# Altium footprint library 6-Connectors-3.PcbLib: 153 footprints (part 6 of 11)
Each footprint in its own frame and in the unit in brackets; x right, y up, seen from the top. Pads: shape width x height; smd on the part's side, far side on the other; paste and mask are expansions set on the pad; w line width, h text height; cw(c..) or ccw(c..) is an arc to the next point about the centre after c.
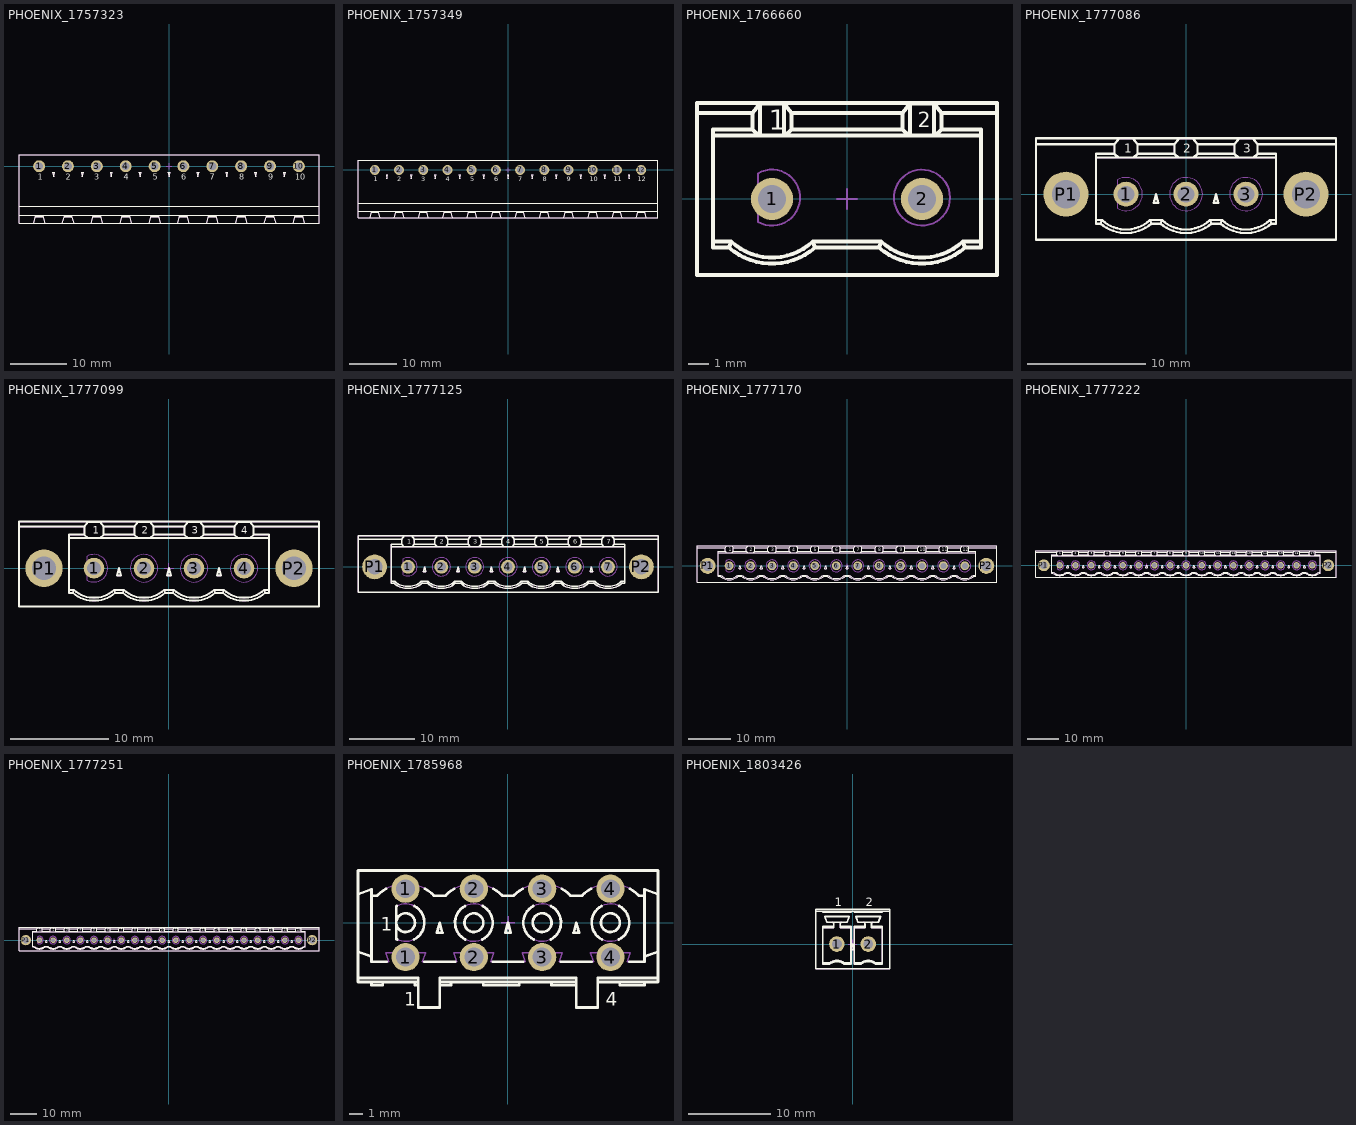
[diagram p5: the footprints below, top view; thin cyan lines are the x and y axes]

## PHOENIX_1757323 [mm] "PHOENIX MSTBA Serie, Pitch 5.08mm, 12A, 250V, 10 Positions Header"
height 8.6
pads (10):
  round 2.1 hole 1.4: 1(-22.86,0) 2(-17.78,0) 3(-12.7,0) 4(-7.62,0) 5(-2.54,0) 6(2.54,0) 7(7.62,0) 8(12.7,0) 9(17.78,0) 10(22.86,0)
Top Overlay:
  lines w0.2: -26.4,-8.626 26.4,-8.626 ; -26.4,-7 26.4,-7 ; -23.835,-10 -23.465,-8.7 -22.255,-8.7 -21.885,-10 ; -23.516,-8.88 -22.204,-8.88 ; -23.105,-8.7 -23.092,-8.75 -22.628,-8.75 -22.615,-8.7 ; -18.755,-10 -18.385,-8.7 -17.175,-8.7 -16.805,-10 ; -18.436,-8.88 -17.124,-8.88 ; -18.025,-8.7 -18.012,-8.75 -17.548,-8.75 -17.535,-8.7 ; -13.675,-10 -13.305,-8.7 -12.095,-8.7 -11.725,-10 ; -13.356,-8.88 -12.044,-8.88 ; -12.945,-8.7 -12.932,-8.75 -12.468,-8.75 -12.455,-8.7 ; -8.595,-10 -8.225,-8.7 -7.015,-8.7 -6.645,-10 ; -8.276,-8.88 -6.964,-8.88 ; -7.865,-8.7 -7.852,-8.75 -7.388,-8.75 -7.375,-8.7 ; -3.515,-10 -3.145,-8.7 -1.935,-8.7 -1.565,-10 ; -3.196,-8.88 -1.884,-8.88 ; -2.785,-8.7 -2.772,-8.75 -2.308,-8.75 -2.295,-8.7 ; 1.565,-10 1.935,-8.7 3.145,-8.7 3.515,-10 ; 1.884,-8.88 3.196,-8.88 ; 2.295,-8.7 2.308,-8.75 2.772,-8.75 2.785,-8.7 ; 6.645,-10 7.015,-8.7 8.225,-8.7 8.595,-10 ; 6.964,-8.88 8.276,-8.88 ; 7.375,-8.7 7.388,-8.75 7.852,-8.75 7.865,-8.7 ; 11.725,-10 12.095,-8.7 13.305,-8.7 13.675,-10 ; 12.044,-8.88 13.356,-8.88 ; 12.455,-8.7 12.468,-8.75 12.932,-8.75 12.945,-8.7 ; 16.805,-10 17.175,-8.7 18.385,-8.7 18.755,-10 ; 17.124,-8.88 18.436,-8.88 ; 17.535,-8.7 17.548,-8.75 18.012,-8.75 18.025,-8.7 ; 21.885,-10 22.255,-8.7 23.465,-8.7 23.835,-10 ; 22.204,-8.88 23.516,-8.88 ; 22.615,-8.7 22.628,-8.75 23.092,-8.75 23.105,-8.7 ; -26.4,-10 -26.4,2 26.4,2 26.4,-10 -26.4,-10 ; -20.521,-1.05 -20.32,-1.8 -20.119,-1.05 -20.521,-1.05 ; -15.441,-1.05 -15.24,-1.8 -15.039,-1.05 -15.441,-1.05 ; -10.361,-1.05 -10.16,-1.8 -9.959,-1.05 -10.361,-1.05 ; -5.281,-1.05 -5.08,-1.8 -4.879,-1.05 -5.281,-1.05 ; -0.201,-1.05 0,-1.8 0.201,-1.05 -0.201,-1.05 ; 4.879,-1.05 5.08,-1.8 5.281,-1.05 4.879,-1.05 ; 9.959,-1.05 10.16,-1.8 10.361,-1.05 9.959,-1.05 ; 15.039,-1.05 15.24,-1.8 15.441,-1.05 15.039,-1.05 ; 20.119,-1.05 20.32,-1.8 20.521,-1.05 20.119,-1.05
  text "3" at -13.14,-2.4 h1
  text "2" at -18.14,-2.4 h1
  text "1" at -23.14,-2.4 h1
  text "4" at -7.94,-2.4 h1
  text "7" at 7.18,-2.4 h1
  text "6" at 2.18,-2.4 h1
  text "5" at -2.82,-2.4 h1
  text "8" at 12.38,-2.4 h1
  text "9" at 17.46,-2.4 h1
  text "10" at 22.2,-2.4 h1
Mechanical 8:
  lines w0.1: -3.04,0 -2.54,0 ; -2.54,-0.5 -2.54,0 ; -2.54,0.5 -2.54,0 ; -2.04,0 -2.54,0 ; -0.5,0 0,0 ; 0,-0.5 0,0 ; 0,0.5 0,0 ; 0.5,0 0,0 ; -22.86,0 -23.36,0 -22.86,0 ; -22.86,0 -22.86,-0.5 -22.86,0 ; -22.86,0 -22.36,0 -22.86,0 ; -22.86,0 -22.86,0.5 -22.86,0 ; -17.78,0 -18.28,0 -17.78,0 ; -17.78,0 -17.78,-0.5 -17.78,0 ; -17.78,0 -17.28,0 -17.78,0 ; -17.78,0 -17.78,0.5 -17.78,0 ; -12.7,0 -13.2,0 -12.7,0 ; -12.7,0 -12.7,-0.5 -12.7,0 ; -12.7,0 -12.2,0 -12.7,0 ; -12.7,0 -12.7,0.5 -12.7,0 ; 2.54,0 2.04,0 2.54,0 ; 2.54,0 2.54,-0.5 2.54,0 ; 2.54,0 3.04,0 2.54,0 ; 2.54,0 2.54,0.5 2.54,0 ; 7.62,0 7.12,0 7.62,0 ; 7.62,0 7.62,-0.5 7.62,0 ; 7.62,0 8.12,0 7.62,0 ; 7.62,0 7.62,0.5 7.62,0 ; 12.7,0 12.2,0 12.7,0 ; 12.7,0 12.7,-0.5 12.7,0 ; 12.7,0 13.2,0 12.7,0 ; 12.7,0 12.7,0.5 12.7,0 ; 17.78,0 17.28,0 17.78,0 ; 17.78,0 17.78,-0.5 17.78,0 ; 17.78,0 18.28,0 17.78,0 ; 17.78,0 17.78,0.5 17.78,0 ; 22.86,0 22.36,0 22.86,0 ; 22.86,0 22.86,-0.5 22.86,0 ; 22.86,0 23.36,0 22.86,0 ; 22.86,0 22.86,0.5 22.86,0
Mechanical 14:
  lines w0.1: -26.4,-8.626 26.4,-8.626 ; -26.4,-7 26.4,-7 ; -23.835,-10 -23.465,-8.7 -22.255,-8.7 -21.885,-10 ; -23.516,-8.88 -22.204,-8.88 ; -23.105,-8.7 -23.092,-8.75 -22.628,-8.75 -22.615,-8.7 ; -18.755,-10 -18.385,-8.7 -17.175,-8.7 -16.805,-10 ; -18.436,-8.88 -17.124,-8.88 ; -18.025,-8.7 -18.012,-8.75 -17.548,-8.75 -17.535,-8.7 ; -13.675,-10 -13.305,-8.7 -12.095,-8.7 -11.725,-10 ; -13.356,-8.88 -12.044,-8.88 ; -12.945,-8.7 -12.932,-8.75 -12.468,-8.75 -12.455,-8.7 ; -8.595,-10 -8.225,-8.7 -7.015,-8.7 -6.645,-10 ; -8.276,-8.88 -6.964,-8.88 ; -7.865,-8.7 -7.852,-8.75 -7.388,-8.75 -7.375,-8.7 ; -3.515,-10 -3.145,-8.7 -1.935,-8.7 -1.565,-10 ; -3.196,-8.88 -1.884,-8.88 ; -2.785,-8.7 -2.772,-8.75 -2.308,-8.75 -2.295,-8.7 ; 1.565,-10 1.935,-8.7 3.145,-8.7 3.515,-10 ; 1.884,-8.88 3.196,-8.88 ; 2.295,-8.7 2.308,-8.75 2.772,-8.75 2.785,-8.7 ; 6.645,-10 7.015,-8.7 8.225,-8.7 8.595,-10 ; 6.964,-8.88 8.276,-8.88 ; 7.375,-8.7 7.388,-8.75 7.852,-8.75 7.865,-8.7 ; 11.725,-10 12.095,-8.7 13.305,-8.7 13.675,-10 ; 12.044,-8.88 13.356,-8.88 ; 12.455,-8.7 12.468,-8.75 12.932,-8.75 12.945,-8.7 ; 16.805,-10 17.175,-8.7 18.385,-8.7 18.755,-10 ; 17.124,-8.88 18.436,-8.88 ; 17.535,-8.7 17.548,-8.75 18.012,-8.75 18.025,-8.7 ; 21.885,-10 22.255,-8.7 23.465,-8.7 23.835,-10 ; 22.204,-8.88 23.516,-8.88 ; 22.615,-8.7 22.628,-8.75 23.092,-8.75 23.105,-8.7 ; -26.4,-10 -26.4,2 26.4,2 26.4,-10 -26.4,-10 ; -20.521,-1.05 -20.32,-1.8 -20.119,-1.05 -20.521,-1.05 ; -15.441,-1.05 -15.24,-1.8 -15.039,-1.05 -15.441,-1.05 ; -10.361,-1.05 -10.16,-1.8 -9.959,-1.05 -10.361,-1.05 ; -5.281,-1.05 -5.08,-1.8 -4.879,-1.05 -5.281,-1.05 ; -0.201,-1.05 0,-1.8 0.201,-1.05 -0.201,-1.05 ; 4.879,-1.05 5.08,-1.8 5.281,-1.05 4.879,-1.05 ; 9.959,-1.05 10.16,-1.8 10.361,-1.05 9.959,-1.05 ; 15.039,-1.05 15.24,-1.8 15.441,-1.05 15.039,-1.05 ; 20.119,-1.05 20.32,-1.8 20.521,-1.05 20.119,-1.05
3D body "PHOENIX_1757323.stp": height 8.6, standoff -3.5, extent -26.4,-10 26.4,2

## PHOENIX_1757349 [mm] "PHOENIX MSTBA Serie, Pitch 5.08mm, 12A, 250V, 12 Positions Header"
height 8.6
pads (12):
  round 2.1 hole 1.4: 1(-27.94,0) 2(-22.86,0) 3(-17.78,0) 4(-12.7,0) 5(-7.62,0) 6(-2.54,0) 7(2.54,0) 8(7.62,0) 9(12.7,0) 10(17.78,0) 11(22.86,0) 12(27.94,0)
Top Overlay:
  lines w0.2: -31.48,-8.626 31.48,-8.626 ; -31.48,-7 31.48,-7 ; -28.915,-10 -28.545,-8.7 -27.335,-8.7 -26.965,-10 ; -28.596,-8.88 -27.284,-8.88 ; -28.185,-8.7 -28.172,-8.75 -27.708,-8.75 -27.695,-8.7 ; -23.835,-10 -23.465,-8.7 -22.255,-8.7 -21.885,-10 ; -23.516,-8.88 -22.204,-8.88 ; -23.105,-8.7 -23.092,-8.75 -22.628,-8.75 -22.615,-8.7 ; -18.755,-10 -18.385,-8.7 -17.175,-8.7 -16.805,-10 ; -18.436,-8.88 -17.124,-8.88 ; -18.025,-8.7 -18.012,-8.75 -17.548,-8.75 -17.535,-8.7 ; -13.675,-10 -13.305,-8.7 -12.095,-8.7 -11.725,-10 ; -13.356,-8.88 -12.044,-8.88 ; -12.945,-8.7 -12.932,-8.75 -12.468,-8.75 -12.455,-8.7 ; -8.595,-10 -8.225,-8.7 -7.015,-8.7 -6.645,-10 ; -8.276,-8.88 -6.964,-8.88 ; -7.865,-8.7 -7.852,-8.75 -7.388,-8.75 -7.375,-8.7 ; -3.515,-10 -3.145,-8.7 -1.935,-8.7 -1.565,-10 ; -3.196,-8.88 -1.884,-8.88 ; -2.785,-8.7 -2.772,-8.75 -2.308,-8.75 -2.295,-8.7 ; 1.565,-10 1.935,-8.7 3.145,-8.7 3.515,-10 ; 1.884,-8.88 3.196,-8.88 ; 2.295,-8.7 2.308,-8.75 2.772,-8.75 2.785,-8.7 ; 6.645,-10 7.015,-8.7 8.225,-8.7 8.595,-10 ; 6.964,-8.88 8.276,-8.88 ; 7.375,-8.7 7.388,-8.75 7.852,-8.75 7.865,-8.7 ; 11.725,-10 12.095,-8.7 13.305,-8.7 13.675,-10 ; 12.044,-8.88 13.356,-8.88 ; 12.455,-8.7 12.468,-8.75 12.932,-8.75 12.945,-8.7 ; 16.805,-10 17.175,-8.7 18.385,-8.7 18.755,-10 ; 17.124,-8.88 18.436,-8.88 ; 17.535,-8.7 17.548,-8.75 18.012,-8.75 18.025,-8.7 ; 21.885,-10 22.255,-8.7 23.465,-8.7 23.835,-10 ; 22.204,-8.88 23.516,-8.88 ; 22.615,-8.7 22.628,-8.75 23.092,-8.75 23.105,-8.7 ; 26.965,-10 27.335,-8.7 28.545,-8.7 28.915,-10 ; 27.284,-8.88 28.596,-8.88 ; 27.695,-8.7 27.708,-8.75 28.172,-8.75 28.185,-8.7 ; -31.48,-10 31.48,-10 31.48,2 -31.48,2 -31.48,-10 ; -25.601,-1.05 -25.199,-1.05 -25.4,-1.8 -25.601,-1.05 ; -20.521,-1.05 -20.119,-1.05 -20.32,-1.8 -20.521,-1.05 ; -15.441,-1.05 -15.039,-1.05 -15.24,-1.8 -15.441,-1.05 ; -10.361,-1.05 -9.959,-1.05 -10.16,-1.8 -10.361,-1.05 ; -5.281,-1.05 -4.879,-1.05 -5.08,-1.8 -5.281,-1.05 ; -0.201,-1.05 0.201,-1.05 0,-1.8 -0.201,-1.05 ; 4.879,-1.05 5.281,-1.05 5.08,-1.8 4.879,-1.05 ; 9.959,-1.05 10.361,-1.05 10.16,-1.8 9.959,-1.05 ; 15.039,-1.05 15.441,-1.05 15.24,-1.8 15.039,-1.05 ; 20.119,-1.05 20.521,-1.05 20.32,-1.8 20.119,-1.05 ; 25.199,-1.05 25.601,-1.05 25.4,-1.8 25.199,-1.05
  text "10" at 17.12,-2.4 h1
  text "9" at 12.38,-2.4 h1
  text "8" at 7.3,-2.4 h1
  text "5" at -7.9,-2.4 h1
  text "6" at -2.9,-2.4 h1
  text "7" at 2.1,-2.4 h1
  text "4" at -13.02,-2.4 h1
  text "1" at -28.22,-2.4 h1
  text "2" at -23.22,-2.4 h1
  text "3" at -18.22,-2.4 h1
  text "11" at 22.2,-2.4 h1
  text "12" at 27.28,-2.4 h1
Mechanical 8:
  lines w0.1: -3.04,0 -2.54,0 ; -2.54,-0.5 -2.54,0 ; -2.54,0.5 -2.54,0 ; -2.04,0 -2.54,0 ; -0.5,0 0,0 ; 0,-0.5 0,0 ; 0,0.5 0,0 ; 0.5,0 0,0 ; -27.94,0 -27.94,0.5 -27.94,0 ; -27.94,0 -27.44,0 -27.94,0 ; -27.94,0 -27.94,-0.5 -27.94,0 ; -27.94,0 -28.44,0 -27.94,0 ; -22.86,0 -22.86,0.5 -22.86,0 ; -22.86,0 -22.36,0 -22.86,0 ; -22.86,0 -22.86,-0.5 -22.86,0 ; -22.86,0 -23.36,0 -22.86,0 ; -17.78,0 -17.78,0.5 -17.78,0 ; -17.78,0 -17.28,0 -17.78,0 ; -17.78,0 -17.78,-0.5 -17.78,0 ; -17.78,0 -18.28,0 -17.78,0 ; -12.7,0 -12.7,0.5 -12.7,0 ; -12.7,0 -12.2,0 -12.7,0 ; -12.7,0 -12.7,-0.5 -12.7,0 ; -12.7,0 -13.2,0 -12.7,0 ; 2.54,0 2.54,0.5 2.54,0 ; 2.54,0 3.04,0 2.54,0 ; 2.54,0 2.54,-0.5 2.54,0 ; 2.54,0 2.04,0 2.54,0 ; 7.62,0 7.62,0.5 7.62,0 ; 7.62,0 8.12,0 7.62,0 ; 7.62,0 7.62,-0.5 7.62,0 ; 7.62,0 7.12,0 7.62,0 ; 12.7,0 12.7,0.5 12.7,0 ; 12.7,0 13.2,0 12.7,0 ; 12.7,0 12.7,-0.5 12.7,0 ; 12.7,0 12.2,0 12.7,0 ; 17.78,0 17.78,0.5 17.78,0 ; 17.78,0 18.28,0 17.78,0 ; 17.78,0 17.78,-0.5 17.78,0 ; 17.78,0 17.28,0 17.78,0 ; 22.86,0 22.86,0.5 22.86,0 ; 22.86,0 23.36,0 22.86,0 ; 22.86,0 22.86,-0.5 22.86,0 ; 22.86,0 22.36,0 22.86,0 ; 27.94,0 27.94,0.5 27.94,0 ; 27.94,0 28.44,0 27.94,0 ; 27.94,0 27.94,-0.5 27.94,0 ; 27.94,0 27.44,0 27.94,0
Mechanical 14:
  lines w0.1: -31.48,-8.626 31.48,-8.626 ; -31.48,-7 31.48,-7 ; -28.915,-10 -28.545,-8.7 -27.335,-8.7 -26.965,-10 ; -28.596,-8.88 -27.284,-8.88 ; -28.185,-8.7 -28.172,-8.75 -27.708,-8.75 -27.695,-8.7 ; -23.835,-10 -23.465,-8.7 -22.255,-8.7 -21.885,-10 ; -23.516,-8.88 -22.204,-8.88 ; -23.105,-8.7 -23.092,-8.75 -22.628,-8.75 -22.615,-8.7 ; -18.755,-10 -18.385,-8.7 -17.175,-8.7 -16.805,-10 ; -18.436,-8.88 -17.124,-8.88 ; -18.025,-8.7 -18.012,-8.75 -17.548,-8.75 -17.535,-8.7 ; -13.675,-10 -13.305,-8.7 -12.095,-8.7 -11.725,-10 ; -13.356,-8.88 -12.044,-8.88 ; -12.945,-8.7 -12.932,-8.75 -12.468,-8.75 -12.455,-8.7 ; -8.595,-10 -8.225,-8.7 -7.015,-8.7 -6.645,-10 ; -8.276,-8.88 -6.964,-8.88 ; -7.865,-8.7 -7.852,-8.75 -7.388,-8.75 -7.375,-8.7 ; -3.515,-10 -3.145,-8.7 -1.935,-8.7 -1.565,-10 ; -3.196,-8.88 -1.884,-8.88 ; -2.785,-8.7 -2.772,-8.75 -2.308,-8.75 -2.295,-8.7 ; 1.565,-10 1.935,-8.7 3.145,-8.7 3.515,-10 ; 1.884,-8.88 3.196,-8.88 ; 2.295,-8.7 2.308,-8.75 2.772,-8.75 2.785,-8.7 ; 6.645,-10 7.015,-8.7 8.225,-8.7 8.595,-10 ; 6.964,-8.88 8.276,-8.88 ; 7.375,-8.7 7.388,-8.75 7.852,-8.75 7.865,-8.7 ; 11.725,-10 12.095,-8.7 13.305,-8.7 13.675,-10 ; 12.044,-8.88 13.356,-8.88 ; 12.455,-8.7 12.468,-8.75 12.932,-8.75 12.945,-8.7 ; 16.805,-10 17.175,-8.7 18.385,-8.7 18.755,-10 ; 17.124,-8.88 18.436,-8.88 ; 17.535,-8.7 17.548,-8.75 18.012,-8.75 18.025,-8.7 ; 21.885,-10 22.255,-8.7 23.465,-8.7 23.835,-10 ; 22.204,-8.88 23.516,-8.88 ; 22.615,-8.7 22.628,-8.75 23.092,-8.75 23.105,-8.7 ; 26.965,-10 27.335,-8.7 28.545,-8.7 28.915,-10 ; 27.284,-8.88 28.596,-8.88 ; 27.695,-8.7 27.708,-8.75 28.172,-8.75 28.185,-8.7 ; -31.48,-10 31.48,-10 31.48,2 -31.48,2 -31.48,-10 ; -25.601,-1.05 -25.199,-1.05 -25.4,-1.8 -25.601,-1.05 ; -20.521,-1.05 -20.119,-1.05 -20.32,-1.8 -20.521,-1.05 ; -15.441,-1.05 -15.039,-1.05 -15.24,-1.8 -15.441,-1.05 ; -10.361,-1.05 -9.959,-1.05 -10.16,-1.8 -10.361,-1.05 ; -5.281,-1.05 -4.879,-1.05 -5.08,-1.8 -5.281,-1.05 ; -0.201,-1.05 0.201,-1.05 0,-1.8 -0.201,-1.05 ; 4.879,-1.05 5.281,-1.05 5.08,-1.8 4.879,-1.05 ; 9.959,-1.05 10.361,-1.05 10.16,-1.8 9.959,-1.05 ; 15.039,-1.05 15.441,-1.05 15.24,-1.8 15.039,-1.05 ; 20.119,-1.05 20.521,-1.05 20.32,-1.8 20.119,-1.05 ; 25.199,-1.05 25.601,-1.05 25.4,-1.8 25.199,-1.05
3D body "PHOENIX_1757349.stp": height 8.6, standoff -3.5, extent -31.48,-10 31.48,2

## PHOENIX_1766660 [mm] "PCB Header, 12A 400 V, Pitch: 7.5mm, 2 Positions, GMSTBVA Serie"
height 12
pads (2):
  round 2.1 hole 1.4: 1(-3.75,0) 2(3.75,0)
Top Overlay:
  lines w0.2: -7.5,4.3 -4.725,4.3 ; -6.7,-2.13 -5.79,-2.13 ; -6.7,3.163 6.7,3.163 ; -4.394,3.163 -4.725,3.475 ; -4.355,3.163 -4.355,4.773 ; -3.145,3.163 -3.145,4.773 ; -3.106,3.163 -2.775,3.475 ; 3.106,3.163 2.775,3.475 ; 3.145,3.163 3.145,4.773 ; 4.355,3.163 4.355,4.773 ; 4.394,3.163 4.725,3.475 ; 6.7,-2.13 5.79,-2.13 ; 7.5,4.3 4.725,4.3 ; -5.904,-2.43 ccw(c-3.75,0.07) -1.596,-2.43 ; -5.904,-2.43 -5.79,-2.13 ; -5.904,-2.43 -6.7,-2.43 -6.7,3.475 -4.725,3.475 ; -5.79,-2.13 ccw(c-3.75,0.07) -1.71,-2.13 ; -4.725,3.475 -4.725,4.3 ; -4.725,4.3 -4.355,4.773 ; -4.355,4.773 -3.145,4.773 ; -3.145,4.773 -2.775,4.3 ; -2.775,3.475 2.775,3.475 ; -2.775,3.475 -2.775,4.3 ; -2.775,4.3 2.775,4.3 ; -1.71,-2.13 1.71,-2.13 ; -1.71,-2.13 -1.596,-2.43 ; -1.596,-2.43 1.596,-2.43 ; 1.596,-2.43 ccw(c3.75,0.07) 5.904,-2.43 ; 1.596,-2.43 1.71,-2.13 ; 1.71,-2.13 ccw(c3.75,0.07) 5.79,-2.13 ; 2.775,3.475 2.775,4.3 ; 2.775,4.3 3.145,4.773 ; 3.145,4.773 4.355,4.773 ; 4.355,4.773 4.725,4.3 ; 4.725,3.475 4.725,4.3 ; 4.725,3.475 6.7,3.475 6.7,-2.43 5.904,-2.43 ; 5.79,-2.13 5.904,-2.43 ; -7.5,-3.8 -7.5,4.8 7.5,4.8 7.5,-3.8 -7.5,-3.8
  text "2" at 3.53,3.575 h0.75
  text "1" at -3.91,3.46 h1
Mechanical 8:
  lines w0.1: -4.25,0 -3.75,0 ; -3.75,-0.5 -3.75,0 ; -3.75,0.5 -3.75,0 ; -3.25,0 -3.75,0 ; -0.5,0 0,0 ; 0,-0.5 0,0 ; 0,0.5 0,0 ; 0.5,0 0,0 ; 3.25,0 3.75,0 ; 3.75,-0.5 3.75,0 ; 3.75,0.5 3.75,0 ; 4.25,0 3.75,0
Mechanical 14:
  circle w0.1: c3.75,0.07 r1.4
  lines w0.1: -7.5,4.3 -4.725,4.3 ; -6.7,-2.13 -5.79,-2.13 ; -6.7,3.163 6.7,3.163 ; -4.394,3.163 -4.725,3.475 ; -4.355,3.163 -4.355,4.773 ; -3.145,3.163 -3.145,4.773 ; -3.106,3.163 -2.775,3.475 ; 3.106,3.163 2.775,3.475 ; 3.145,3.163 3.145,4.773 ; 4.355,3.163 4.355,4.773 ; 4.394,3.163 4.725,3.475 ; 6.7,-2.13 5.79,-2.13 ; 7.5,4.3 4.725,4.3 ; -5.904,-2.43 ccw(c-3.75,0.07) -1.596,-2.43 ; -5.904,-2.43 -5.79,-2.13 ; -5.904,-2.43 -6.7,-2.43 -6.7,3.475 -4.725,3.475 ; -5.79,-2.13 ccw(c-3.75,0.07) -1.71,-2.13 ; -4.725,3.475 -4.725,4.3 ; -4.725,4.3 -4.355,4.773 ; -4.355,4.773 -3.145,4.773 ; -3.145,4.773 -2.775,4.3 ; -2.775,3.475 2.775,3.475 ; -2.775,3.475 -2.775,4.3 ; -2.775,4.3 2.775,4.3 ; -1.71,-2.13 1.71,-2.13 ; -1.71,-2.13 -1.596,-2.43 ; -1.596,-2.43 1.596,-2.43 ; 1.596,-2.43 ccw(c3.75,0.07) 5.904,-2.43 ; 1.596,-2.43 1.71,-2.13 ; 1.71,-2.13 ccw(c3.75,0.07) 5.79,-2.13 ; 2.775,3.475 2.775,4.3 ; 2.775,4.3 3.145,4.773 ; 3.145,4.773 4.355,4.773 ; 4.355,4.773 4.725,4.3 ; 4.725,3.475 4.725,4.3 ; 4.725,3.475 6.7,3.475 6.7,-2.43 5.904,-2.43 ; 5.79,-2.13 5.904,-2.43 ; -7.5,-3.8 -7.5,4.8 7.5,4.8 7.5,-3.8 -7.5,-3.8 ; -4.45,-1.142 ccw(c-3.75,0.07) -4.45,1.282 -4.45,-1.142
  text "2" at 3.53,3.575 h0.75
  text "1" at -3.91,3.46 h1
3D body "PHOENIX_1766660.stp": height 12, standoff -3.9, extent -7.5,-3.8 7.5,4.8

## PHOENIX_1777086 [mm] "PCB Header, 12A, 320V, Pitch: 5.08mm, 3 Positions, MSTBV Serie"
height 12
pads (5):
  round 2.1 hole 1.4: 1(-5.08,0) 2(0,0) 3(5.08,0)
  round 3.8 hole 2.4: P1(-10.16,0) P2(10.16,0)
Top Overlay:
  lines w0.2: -12.7,4.23 -6.055,4.23 ; -7.62,-2.2 -7.12,-2.2 ; -7.62,3.093 7.62,3.093 ; -5.724,3.093 -6.055,3.405 ; -4.436,3.093 -4.105,3.405 ; -0.644,3.093 -0.975,3.405 ; 0.644,3.093 0.975,3.405 ; 4.436,3.093 4.105,3.405 ; 5.724,3.093 6.055,3.405 ; 7.62,-2.2 7.12,-2.2 ; 12.7,4.23 6.055,4.23 ; -7.234,-2.5 ccw(c-5.08,0) -2.926,-2.5 ; -7.234,-2.5 -7.12,-2.2 ; -7.234,-2.5 -7.62,-2.5 -7.62,3.405 -6.055,3.405 ; -7.12,-2.2 ccw(c-5.08,0) -3.04,-2.2 ; -6.055,3.405 -6.055,4.23 ; -6.055,4.23 -5.685,4.703 -4.475,4.703 -4.105,4.23 ; -4.105,3.405 -4.105,4.23 ; -4.105,3.405 -0.975,3.405 ; -4.105,4.23 -0.975,4.23 ; -3.04,-2.2 -2.04,-2.2 ; -3.04,-2.2 -2.926,-2.5 ; -2.926,-2.5 -2.154,-2.5 ; -2.154,-2.5 ccw(c0,0) 2.154,-2.5 ; -2.154,-2.5 -2.04,-2.2 ; -2.04,-2.2 ccw(c0,0) 2.04,-2.2 ; -0.975,3.405 -0.975,4.23 ; -0.975,4.23 -0.605,4.703 0.605,4.703 0.975,4.23 ; 0.975,3.405 0.975,4.23 ; 0.975,3.405 4.105,3.405 ; 0.975,4.23 4.105,4.23 ; 2.04,-2.2 3.04,-2.2 ; 2.04,-2.2 2.154,-2.5 ; 2.154,-2.5 2.926,-2.5 ; 2.926,-2.5 ccw(c5.08,0) 7.234,-2.5 ; 2.926,-2.5 3.04,-2.2 ; 3.04,-2.2 ccw(c5.08,0) 7.12,-2.2 ; 4.105,3.405 4.105,4.23 ; 4.105,4.23 4.475,4.703 5.685,4.703 6.055,4.23 ; 6.055,3.405 6.055,4.23 ; 6.055,3.405 7.62,3.405 7.62,-2.5 7.234,-2.5 ; 7.12,-2.2 7.234,-2.5 ; -12.7,-3.87 12.7,-3.87 12.7,4.73 -12.7,4.73 -12.7,-3.87 ; -2.741,-0.75 -2.339,-0.75 -2.54,0 -2.741,-0.75 ; 2.339,-0.75 2.741,-0.75 2.54,0 2.339,-0.75
  text "1" at -5.22,3.505 h0.75
  text "2" at -0.22,3.505 h0.75
  text "3" at 4.851,3.505 h0.75
Mechanical 8:
  lines w0.1: -10.66,0 -10.16,0 ; -10.16,-0.5 -10.16,0 ; -10.16,0.5 -10.16,0 ; -9.66,0 -10.16,0 ; -5.58,0 -5.08,0 ; -5.08,-0.5 -5.08,0 ; -5.08,0.5 -5.08,0 ; -4.58,0 -5.08,0 ; -0.5,0 0,0 ; 0,-0.5 0,0 ; 0,0.5 0,0 ; 0.5,0 0,0 ; 4.58,0 5.08,0 ; 5.08,-0.5 5.08,0 ; 5.08,0.5 5.08,0 ; 5.58,0 5.08,0 ; 9.66,0 10.16,0 ; 10.16,-0.5 10.16,0 ; 10.16,0.5 10.16,0 ; 10.66,0 10.16,0
Mechanical 14:
  circle w0.1: c5.08,0 r1.4
  circle w0.1: c0,0 r1.4
  circle w0.1: c-10.16,0 r1.25
  circle w0.1: c10.16,0 r1.25
  lines w0.1: -12.7,4.23 -6.055,4.23 ; -7.62,-2.2 -7.12,-2.2 ; -7.62,3.093 7.62,3.093 ; -5.724,3.093 -6.055,3.405 ; -4.436,3.093 -4.105,3.405 ; -0.644,3.093 -0.975,3.405 ; 0.644,3.093 0.975,3.405 ; 4.436,3.093 4.105,3.405 ; 5.724,3.093 6.055,3.405 ; 7.62,-2.2 7.12,-2.2 ; 12.7,4.23 6.055,4.23 ; -7.234,-2.5 ccw(c-5.08,0) -2.926,-2.5 ; -7.234,-2.5 -7.12,-2.2 ; -7.234,-2.5 -7.62,-2.5 -7.62,3.405 -6.055,3.405 ; -7.12,-2.2 ccw(c-5.08,0) -3.04,-2.2 ; -6.055,3.405 -6.055,4.23 ; -6.055,4.23 -5.685,4.703 -4.475,4.703 -4.105,4.23 ; -5.58,-0.5 -4.58,-0.5 ; -5.58,-0.5 -5.58,0.5 ; -5.58,-0.5 -5.312,-0.232 ; -5.58,0.5 -4.58,0.5 ; -5.58,0.5 -5.312,0.232 ; -5.312,-0.232 -4.848,-0.232 ; -5.312,-0.232 -5.312,0.232 ; -5.312,0.232 -4.848,0.232 ; -4.848,-0.232 -4.848,0.232 ; -4.848,-0.232 -4.58,-0.5 ; -4.848,0.232 -4.58,0.5 ; -4.58,-0.5 -4.58,0.5 ; -4.105,3.405 -4.105,4.23 ; -4.105,3.405 -0.975,3.405 ; -4.105,4.23 -0.975,4.23 ; -3.04,-2.2 -2.04,-2.2 ; -3.04,-2.2 -2.926,-2.5 ; -2.926,-2.5 -2.154,-2.5 ; -2.154,-2.5 ccw(c0,0) 2.154,-2.5 ; -2.154,-2.5 -2.04,-2.2 ; -2.04,-2.2 ccw(c0,0) 2.04,-2.2 ; -0.975,3.405 -0.975,4.23 ; -0.975,4.23 -0.605,4.703 0.605,4.703 0.975,4.23 ; -0.5,-0.5 -0.5,0.5 ; -0.5,-0.5 0.5,-0.5 ; -0.5,-0.5 -0.232,-0.232 ; -0.5,0.5 0.5,0.5 ; -0.5,0.5 -0.232,0.232 ; -0.232,-0.232 0.232,-0.232 ; -0.232,-0.232 -0.232,0.232 ; -0.232,0.232 0.232,0.232 ; 0.232,-0.232 0.232,0.232 ; 0.232,-0.232 0.5,-0.5 ; 0.232,0.232 0.5,0.5 ; 0.5,-0.5 0.5,0.5 ; 0.975,3.405 0.975,4.23 ; 0.975,3.405 4.105,3.405 ; 0.975,4.23 4.105,4.23 ; 2.04,-2.2 3.04,-2.2 ; 2.04,-2.2 2.154,-2.5 ; 2.154,-2.5 2.926,-2.5 ; 2.926,-2.5 ccw(c5.08,0) 7.234,-2.5 ; 2.926,-2.5 3.04,-2.2 ; 3.04,-2.2 ccw(c5.08,0) 7.12,-2.2 ; 4.105,3.405 4.105,4.23 ; 4.105,4.23 4.475,4.703 5.685,4.703 6.055,4.23 ; 4.58,-0.5 4.58,0.5 ; 4.58,-0.5 5.58,-0.5 ; 4.58,-0.5 4.848,-0.232 ; 4.58,0.5 5.58,0.5 ; 4.58,0.5 4.848,0.232 ; 4.848,-0.232 5.312,-0.232 ; 4.848,-0.232 4.848,0.232 ; 4.848,0.232 5.312,0.232 ; 5.312,-0.232 5.312,0.232 ; 5.312,-0.232 5.58,-0.5 ; 5.312,0.232 5.58,0.5 ; 5.58,-0.5 5.58,0.5 ; 6.055,3.405 6.055,4.23 ; 6.055,3.405 7.62,3.405 7.62,-2.5 7.234,-2.5 ; 7.12,-2.2 7.234,-2.5 ; -12.7,-3.87 12.7,-3.87 12.7,4.73 -12.7,4.73 -12.7,-3.87 ; -5.78,-1.212 ccw(c-5.08,0) -5.78,1.212 -5.78,-1.212 ; -2.741,-0.75 -2.339,-0.75 -2.54,0 -2.741,-0.75 ; 2.339,-0.75 2.741,-0.75 2.54,0 2.339,-0.75
  text "3" at 4.851,3.505 h0.75
  text "2" at -0.22,3.505 h0.75
  text "1" at -5.22,3.505 h0.75
3D body "PHOENIX_1777086.stp": height 12, standoff -3.9, extent -12.7,-3.8 12.7,4.8

## PHOENIX_1777099 [mm] "PCB Header, 12A, 320V, Pitch: 5.08mm, 4 Positions, MSTBV Serie"
height 12
pads (6):
  round 2.1 hole 1.4: 1(-7.62,0) 2(-2.54,0) 3(2.54,0) 4(7.62,0)
  round 3.8 hole 2.4: P1(-12.7,0) P2(12.7,0)
Top Overlay:
  lines w0.2: -15.24,4.23 -8.595,4.23 ; -10.16,-2.2 -9.66,-2.2 ; -10.16,3.093 10.16,3.093 ; -8.264,3.093 -8.595,3.405 ; -6.976,3.093 -6.645,3.405 ; -3.184,3.093 -3.515,3.405 ; -1.896,3.093 -1.565,3.405 ; 1.896,3.093 1.565,3.405 ; 3.184,3.093 3.515,3.405 ; 6.976,3.093 6.645,3.405 ; 8.264,3.093 8.595,3.405 ; 10.16,-2.2 9.66,-2.2 ; 15.24,4.23 8.595,4.23 ; -9.774,-2.5 ccw(c-7.62,0) -5.466,-2.5 ; -9.774,-2.5 -9.66,-2.2 ; -9.774,-2.5 -10.16,-2.5 -10.16,3.405 -8.595,3.405 ; -9.66,-2.2 ccw(c-7.62,0) -5.58,-2.2 ; -8.595,3.405 -8.595,4.23 ; -8.595,4.23 -8.225,4.703 -7.015,4.703 -6.645,4.23 ; -6.645,3.405 -6.645,4.23 ; -6.645,3.405 -3.515,3.405 ; -6.645,4.23 -3.515,4.23 ; -5.58,-2.2 -4.58,-2.2 ; -5.58,-2.2 -5.466,-2.5 ; -5.466,-2.5 -4.694,-2.5 ; -4.694,-2.5 ccw(c-2.54,0) -0.386,-2.5 ; -4.694,-2.5 -4.58,-2.2 ; -4.58,-2.2 ccw(c-2.54,0) -0.5,-2.2 ; -3.515,3.405 -3.515,4.23 ; -3.515,4.23 -3.145,4.703 -1.935,4.703 -1.565,4.23 ; -1.565,3.405 -1.565,4.23 ; -1.565,3.405 1.565,3.405 ; -1.565,4.23 1.565,4.23 ; -0.5,-2.2 0.5,-2.2 ; -0.5,-2.2 -0.386,-2.5 ; -0.386,-2.5 0.386,-2.5 ; 0.386,-2.5 ccw(c2.54,0) 4.694,-2.5 ; 0.386,-2.5 0.5,-2.2 ; 0.5,-2.2 ccw(c2.54,0) 4.58,-2.2 ; 1.565,3.405 1.565,4.23 ; 1.565,4.23 1.935,4.703 3.145,4.703 3.515,4.23 ; 3.515,3.405 3.515,4.23 ; 3.515,3.405 6.645,3.405 ; 3.515,4.23 6.645,4.23 ; 4.58,-2.2 5.58,-2.2 ; 4.58,-2.2 4.694,-2.5 ; 4.694,-2.5 5.466,-2.5 ; 5.466,-2.5 ccw(c7.62,0) 9.774,-2.5 ; 5.466,-2.5 5.58,-2.2 ; 5.58,-2.2 ccw(c7.62,0) 9.66,-2.2 ; 6.645,3.405 6.645,4.23 ; 6.645,4.23 7.015,4.703 8.225,4.703 8.595,4.23 ; 8.595,3.405 8.595,4.23 ; 8.595,3.405 10.16,3.405 10.16,-2.5 9.774,-2.5 ; 9.66,-2.2 9.774,-2.5 ; -15.24,-3.87 15.24,-3.87 15.24,4.73 -15.24,4.73 -15.24,-3.87 ; -5.281,-0.75 -4.879,-0.75 -5.08,0 -5.281,-0.75 ; -0.201,-0.75 0.201,-0.75 0,0 -0.201,-0.75 ; 4.879,-0.75 5.281,-0.75 5.08,0 4.879,-0.75
  text "4" at 7.366,3.505 h0.75
  text "3" at 2.311,3.505 h0.75
  text "2" at -2.76,3.505 h0.75
  text "1" at -7.76,3.505 h0.75
Mechanical 8:
  lines w0.1: -13.2,0 -12.7,0 ; -12.7,-0.5 -12.7,0 ; -12.7,0.5 -12.7,0 ; -12.2,0 -12.7,0 ; -8.12,0 -7.62,0 ; -7.62,-0.5 -7.62,0 ; -7.62,0.5 -7.62,0 ; -7.12,0 -7.62,0 ; -3.04,0 -2.54,0 ; -2.54,-0.5 -2.54,0 ; -2.54,0.5 -2.54,0 ; -2.04,0 -2.54,0 ; -0.5,0 0,0 ; 0,-0.5 0,0 ; 0,0.5 0,0 ; 0.5,0 0,0 ; 2.04,0 2.54,0 ; 2.54,-0.5 2.54,0 ; 2.54,0.5 2.54,0 ; 3.04,0 2.54,0 ; 7.12,0 7.62,0 ; 7.62,-0.5 7.62,0 ; 7.62,0.5 7.62,0 ; 8.12,0 7.62,0 ; 12.2,0 12.7,0 ; 12.7,-0.5 12.7,0 ; 12.7,0.5 12.7,0 ; 13.2,0 12.7,0
Mechanical 14:
  circle w0.1: c7.62,0 r1.4
  circle w0.1: c-2.54,0 r1.4
  circle w0.1: c-12.7,0 r1.25
  circle w0.1: c12.7,0 r1.25
  circle w0.1: c2.54,0 r1.4
  lines w0.1: -15.24,4.23 -8.595,4.23 ; -10.16,-2.2 -9.66,-2.2 ; -10.16,3.093 10.16,3.093 ; -8.264,3.093 -8.595,3.405 ; -6.976,3.093 -6.645,3.405 ; -3.184,3.093 -3.515,3.405 ; -1.896,3.093 -1.565,3.405 ; 1.896,3.093 1.565,3.405 ; 3.184,3.093 3.515,3.405 ; 6.976,3.093 6.645,3.405 ; 8.264,3.093 8.595,3.405 ; 10.16,-2.2 9.66,-2.2 ; 15.24,4.23 8.595,4.23 ; -9.774,-2.5 ccw(c-7.62,0) -5.466,-2.5 ; -9.774,-2.5 -9.66,-2.2 ; -9.774,-2.5 -10.16,-2.5 -10.16,3.405 -8.595,3.405 ; -9.66,-2.2 ccw(c-7.62,0) -5.58,-2.2 ; -8.595,3.405 -8.595,4.23 ; -8.595,4.23 -8.225,4.703 -7.015,4.703 -6.645,4.23 ; -8.12,-0.5 -7.12,-0.5 ; -8.12,-0.5 -8.12,0.5 ; -8.12,-0.5 -7.852,-0.232 ; -8.12,0.5 -7.12,0.5 ; -8.12,0.5 -7.852,0.232 ; -7.852,-0.232 -7.388,-0.232 ; -7.852,-0.232 -7.852,0.232 ; -7.852,0.232 -7.388,0.232 ; -7.388,-0.232 -7.388,0.232 ; -7.388,-0.232 -7.12,-0.5 ; -7.388,0.232 -7.12,0.5 ; -7.12,-0.5 -7.12,0.5 ; -6.645,3.405 -6.645,4.23 ; -6.645,3.405 -3.515,3.405 ; -6.645,4.23 -3.515,4.23 ; -5.58,-2.2 -4.58,-2.2 ; -5.58,-2.2 -5.466,-2.5 ; -5.466,-2.5 -4.694,-2.5 ; -4.694,-2.5 ccw(c-2.54,0) -0.386,-2.5 ; -4.694,-2.5 -4.58,-2.2 ; -4.58,-2.2 ccw(c-2.54,0) -0.5,-2.2 ; -3.515,3.405 -3.515,4.23 ; -3.515,4.23 -3.145,4.703 -1.935,4.703 -1.565,4.23 ; -3.04,-0.5 -3.04,0.5 ; -3.04,-0.5 -2.04,-0.5 ; -3.04,-0.5 -2.772,-0.232 ; -3.04,0.5 -2.04,0.5 ; -3.04,0.5 -2.772,0.232 ; -2.772,-0.232 -2.308,-0.232 ; -2.772,-0.232 -2.772,0.232 ; -2.772,0.232 -2.308,0.232 ; -2.308,-0.232 -2.308,0.232 ; -2.308,-0.232 -2.04,-0.5 ; -2.308,0.232 -2.04,0.5 ; -2.04,-0.5 -2.04,0.5 ; -1.565,3.405 -1.565,4.23 ; -1.565,3.405 1.565,3.405 ; -1.565,4.23 1.565,4.23 ; -0.5,-2.2 0.5,-2.2 ; -0.5,-2.2 -0.386,-2.5 ; -0.386,-2.5 0.386,-2.5 ; 0.386,-2.5 ccw(c2.54,0) 4.694,-2.5 ; 0.386,-2.5 0.5,-2.2 ; 0.5,-2.2 ccw(c2.54,0) 4.58,-2.2 ; 1.565,3.405 1.565,4.23 ; 1.565,4.23 1.935,4.703 3.145,4.703 3.515,4.23 ; 2.04,-0.5 2.04,0.5 ; 2.04,-0.5 3.04,-0.5 ; 2.04,-0.5 2.308,-0.232 ; 2.04,0.5 3.04,0.5 ; 2.04,0.5 2.308,0.232 ; 2.308,-0.232 2.772,-0.232 ; 2.308,-0.232 2.308,0.232 ; 2.308,0.232 2.772,0.232 ; 2.772,-0.232 2.772,0.232 ; 2.772,-0.232 3.04,-0.5 ; 2.772,0.232 3.04,0.5 ; 3.04,-0.5 3.04,0.5 ; 3.515,3.405 3.515,4.23 ; 3.515,3.405 6.645,3.405 ; 3.515,4.23 6.645,4.23 ; 4.58,-2.2 5.58,-2.2 ; 4.58,-2.2 4.694,-2.5 ; 4.694,-2.5 5.466,-2.5 ; 5.466,-2.5 ccw(c7.62,0) 9.774,-2.5 ; 5.466,-2.5 5.58,-2.2 ; 5.58,-2.2 ccw(c7.62,0) 9.66,-2.2 ; 6.645,3.405 6.645,4.23 ; 6.645,4.23 7.015,4.703 8.225,4.703 8.595,4.23 ; 7.12,-0.5 7.12,0.5 ; 7.12,-0.5 8.12,-0.5 ; 7.12,-0.5 7.388,-0.232 ; 7.12,0.5 8.12,0.5 ; 7.12,0.5 7.388,0.232 ; 7.388,-0.232 7.852,-0.232 ; 7.388,-0.232 7.388,0.232 ; 7.388,0.232 7.852,0.232 ; 7.852,-0.232 7.852,0.232 ; 7.852,-0.232 8.12,-0.5 ; 7.852,0.232 8.12,0.5 ; 8.12,-0.5 8.12,0.5 ; 8.595,3.405 8.595,4.23 ; 8.595,3.405 10.16,3.405 10.16,-2.5 9.774,-2.5 ; 9.66,-2.2 9.774,-2.5 ; -15.24,-3.87 15.24,-3.87 15.24,4.73 -15.24,4.73 -15.24,-3.87 ; -8.32,-1.212 ccw(c-7.62,0) -8.32,1.212 -8.32,-1.212 ; -5.281,-0.75 -4.879,-0.75 -5.08,0 -5.281,-0.75 ; -0.201,-0.75 0.201,-0.75 0,0 -0.201,-0.75 ; 4.879,-0.75 5.281,-0.75 5.08,0 4.879,-0.75